# Altium footprint library Control_Board_Model.PcbLib: 160 footprints (part 3 of 10)
Each footprint in its own frame and in the unit in brackets; x right, y up, seen from the top. Pads: shape width x height; smd on the part's side, far side on the other; paste and mask are expansions set on the pad; w line width, h text height; cw(c..) or ccw(c..) is an arc to the next point about the centre after c.
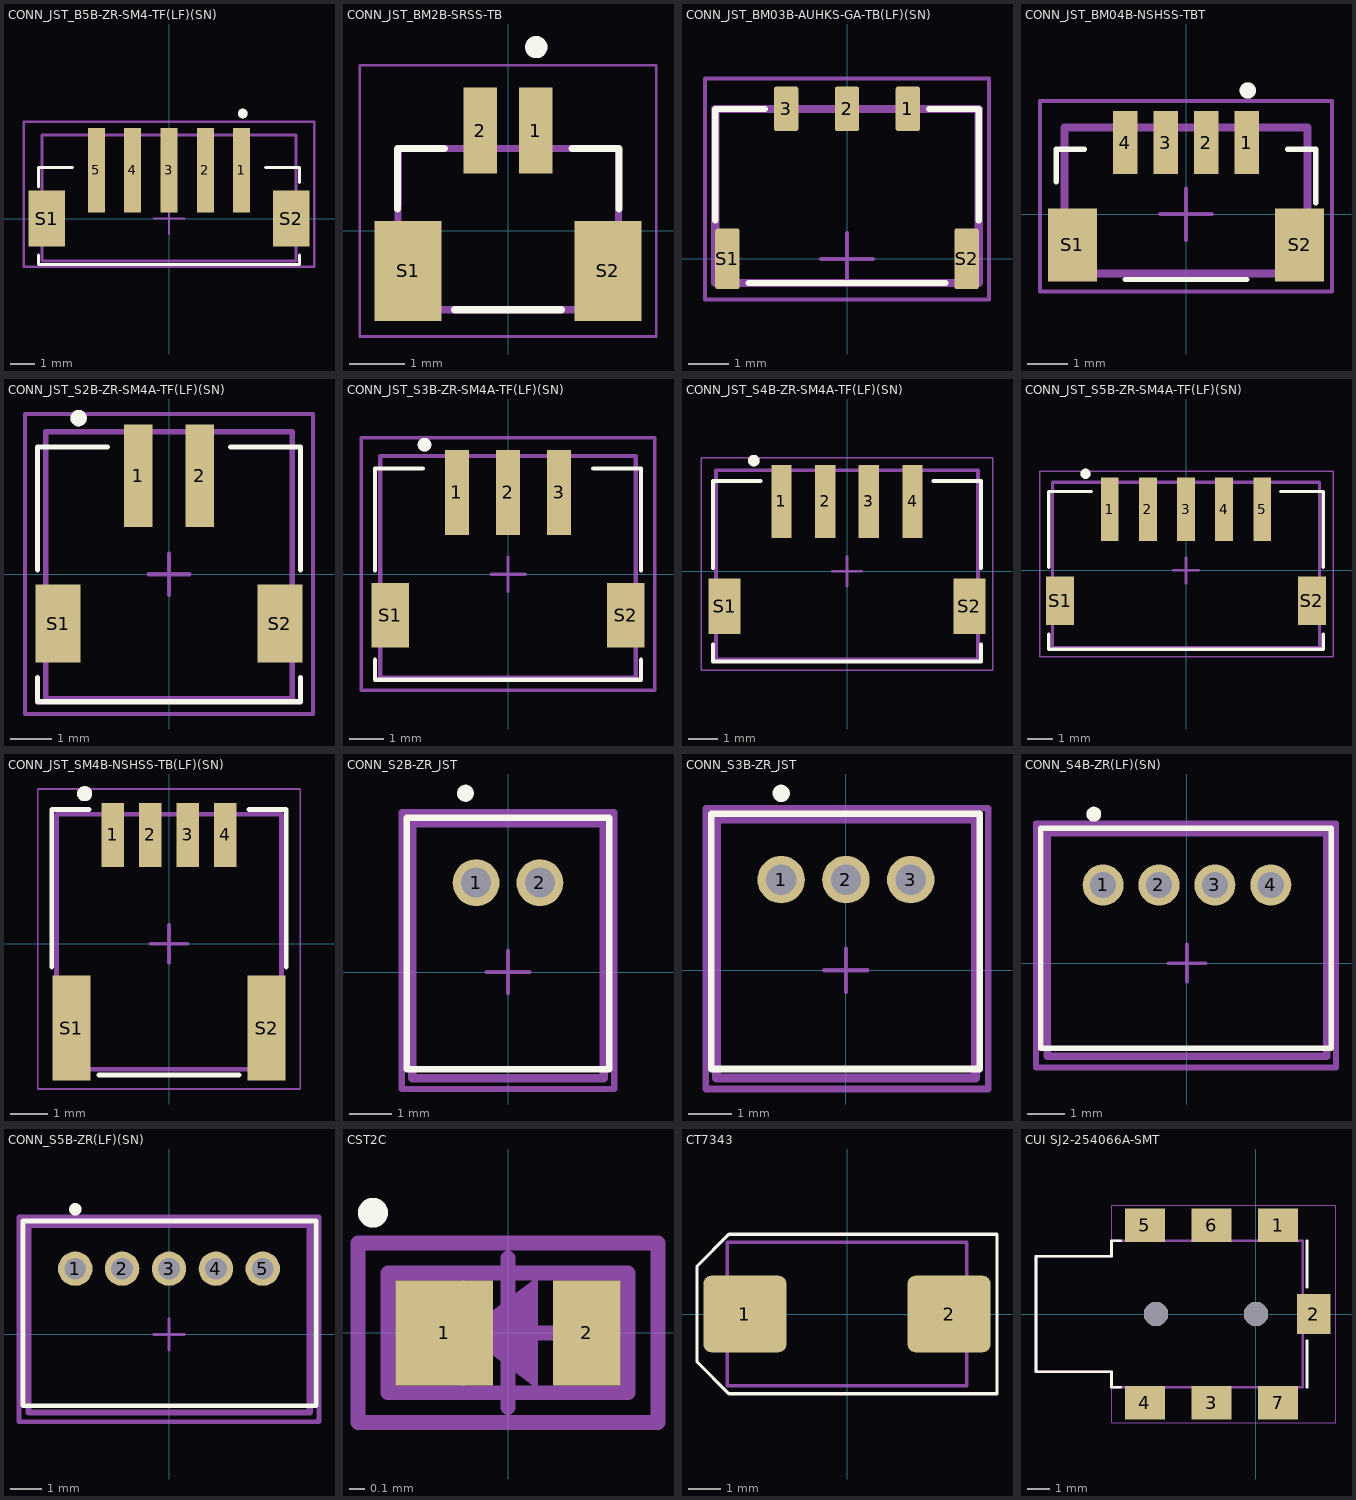
[diagram p2: the footprints below, top view; thin cyan lines are the x and y axes]

## CONN_JST_B5B-ZR-SM4-TF(LF)(SN) [mm]
pads (7):
  rect 0.7x3.5 smd: 1(3,2) 2(1.5,2) 3(0,2) 4(-1.5,2) 5(-3,2)
  rect 1.5x2.3 smd: S1(-5.05,0) S2(5.05,0)
Top Overlay:
  circle w0.2: c3.048,4.34 r0.1
  lines w0.127: -5.4,-1.5 -5.4,-1.9 5.4,-1.9 5.4,-1.5 ; -5.4,1.31 -5.4,2.1 -4,2.1 ; 4,2.1 5.4,2.1 5.4,1.5
Mechanical 14:
  circle w0.2: c3.048,4.34 r0.1
  lines w0.127: -5.25,-1.75 -5.25,3.45 5.25,3.45 5.25,-1.75 -5.25,-1.75
  text "'.Designator'" at -1.6,-0.2 h0.5
Mechanical 15:
  lines w0.1: -0.635,0 0.635,0 ; 0,-0.635 0,0.635 ; -6,-2 6,-2 6,4 -6,4 -6,-2
3D body "B5B-ZR-SM4-TF.STEP": height 5, standoff 0, extent -5.25,-1.75 5.25,3.45

## CONN_JST_BM2B-SRSS-TB [mm]
pads (4):
  rect 0.6x1.55 smd: 1(0.5,1.8) 2(-0.5,1.8)
  rect 1.2x1.8 smd: S1(-1.8,-0.725) S2(1.8,-0.725)
Top Overlay:
  circle w0.2: c0.508,3.302 r0.1
  lines w0.127: -1.99,0.386 -1.99,1.105 -1.99,1.475 -1.143,1.475 ; -0.96,-1.425 0.965,-1.425 ; 1.15,1.475 1.997,1.475 1.997,0.393
Mechanical 13:
  circle w0.2: c0.508,3.302 r0.1
  lines w0.127: -1.977,-1.372 -1.977,1.141 ; -1.969,0.468 -1.969,1.475 1.989,1.475 1.989,-1.425 -1.905,-1.425
Mechanical 15:
  lines w0.05: 0.976,2.974 2.667,2.974 2.667,-1.905 -2.667,-1.905 -2.667,2.974 2.5,2.974
3D body "BM02B-SRSS-TB.STEP": height 4.25, standoff -0.07, extent -2,-1.425 2,2.175

## CONN_JST_BM03B-AUHKS-GA-TB(LF)(SN) [mm] "Connector Header Surface Mount, Right Angle 3 position"
height 1.85
pads (5):
  rrect20% 0.6x1.1 smd mask+0.05: 1(1.5,3.7) 2(0,3.7) 3(-1.5,3.7)
  rrect20% 0.6x1.5 smd mask+0.05: S1(-2.95,0) S2(2.95,0)
Top Overlay:
  lines w0.15: -3.25,0.95 -3.25,3.7 -2.025,3.7 ; -2.425,-0.6 2.425,-0.6 ; 2.025,3.7 3.25,3.7 3.25,0.95
Mechanical 14:
  lines w0.2: -3.25,-0.6 -3.25,3.7 3.25,3.7 3.25,-0.6 -3.25,-0.6
Mechanical 15:
  lines w0.1: -0.635,0 0.635,0 ; 0,-0.635 0,0.635 ; -3.5,-1 -3.5,4.445 3.5,4.445 3.5,-1 -3.5,-1
3D body "BM03B-AUHKS.STEP": height 1.85, standoff 0, extent -3.275,-0.6 3.275,3.9

## CONN_JST_BM04B-NSHSS-TBT [mm] "Connector Header Surface Mount 4 position 0.039\" (1.00mm)"
height 4.25
pads (6):
  rect 0.6x1.55 smd: 1(1.5,1.762) 2(0.5,1.762) 3(-0.5,1.762) 4(-1.5,1.762)
  rect 1.2x1.8 smd: S1(-2.8,-0.763) S2(2.8,-0.763)
Top Overlay:
  circle w0.2: c1.524,3.048 r0.1
  lines w0.127: -3.2,0.787 -3.2,1.6 -2.5,1.6 ; -1.5,-1.613 1.5,-1.613 ; 2.5,1.6 3.2,1.6 3.2,0.279
Mechanical 14:
  lines w0.2: 1.624,3.048 cw(c1.524,3.048) 1.624,3.055 ; -3,-1.463 3,-1.463 3,2.137 -3,2.137 -3,-1.463
Mechanical 15:
  lines w0.1: -0.635,0 0.635,0 ; 0,-0.635 0,0.635 ; -3.6,-1.913 3.6,-1.913 3.6,2.788 -3.6,2.788 -3.6,-1.913
3D body "BM04B-SRSS-TB.STEP": height 4.25, standoff -0.07, extent -3,-1.463 3,2.137

## CONN_JST_S2B-ZR-SM4A-TF(LF)(SN) [mm] "Connector Header Surface Mount, Right Angle 2 position 0.059\" (1.50mm)"
height 3.7
pads (4):
  rect 0.7x2.5 smd: 1(-0.75,2.4) 2(0.75,2.4)
  rect 1.1x1.9 smd: S1(-2.7,-1.2) S2(2.7,-1.2)
Top Overlay:
  circle w0.2: c-2.2,3.8 r0.1
  lines w0.127: -3.2,-2.51 -3.2,-3.1 3.2,-3.1 3.2,-2.51 ; -3.2,0.11 -3.2,3.1 -1.5,3.1 ; 1.5,3.1 3.2,3.1 3.2,0.11
Mechanical 14:
  circle w0.2: c-2.2,3.8 r0.1
  lines w0.127: -3,-3.031 3,-3.031 3,3.469 -3,3.469 -3,-3.031
  text "'.Designator'" at -1.5,0 h0.5
Mechanical 15:
  lines w0.1: -0.5,0 0.5,0 ; 0,-0.5 0,0.5 ; -3.5,-3.4 3.5,-3.4 3.5,3.9 -3.5,3.9 -3.5,-3.4
3D body "S2B-ZR-SM4A-TF.STEP": height 3.7, standoff 0, extent -3,-3.031 3,3.469

## CONN_JST_S3B-ZR-SM4A-TF(LF)(SN) [mm]
pads (5):
  rect 0.7x2.5 smd: 1(-1.5,2.4) 2(0,2.4) 3(1.5,2.4)
  rect 1.1x1.9 smd: S1(-3.45,-1.2) S2(3.45,-1.2)
Top Overlay:
  circle w0.2: c-2.45,3.8 r0.1
  lines w0.127: -3.9,-2.51 -3.9,-3.1 3.9,-3.1 3.9,-2.51 ; -3.9,0.11 -3.9,3.1 -2.5,3.1 ; 2.5,3.1 3.9,3.1 3.9,0.11
Mechanical 14:
  circle w0.2: c-2.45,3.8 r0.1
  lines w0.127: -3.75,-3.031 -3.75,3.469 3.75,3.469 3.75,-3.031 -3.75,-3.031
  text "'.Designator'" at -1.4,-0.2 h0.5
Mechanical 15:
  lines w0.1: -0.5,0 0.5,0 ; 0,-0.5 0,0.5 ; -4.3,-3.4 -4.3,4 4.3,4 4.3,-3.4 -4.3,-3.4
3D body "S3B-ZR-SM4A-TF.STEP": height 3.7, standoff 0, extent -3.75,-3.031 3.75,3.469

## CONN_JST_S4B-ZR-SM4A-TF(LF)(SN) [mm]
pads (6):
  rect 0.7x2.5 smd: 1(-2.25,2.4) 2(-0.75,2.4) 3(0.75,2.4) 4(2.25,2.4)
  rect 1.1x1.9 smd: S1(-4.2,-1.2) S2(4.2,-1.2)
Top Overlay:
  circle w0.2: c-3.2,3.8 r0.1
  lines w0.127: -4.6,-2.51 -4.6,-3.1 4.6,-3.1 4.6,-2.51 ; -4.6,0.11 -4.6,3.1 -2.97,3.1 ; 2.97,3.1 4.6,3.1 4.6,0.11
Mechanical 14:
  circle w0.2: c-3.2,3.8 r0.1
  lines w0.127: -4.5,-3.031 4.5,-3.031 4.5,3.469 -4.5,3.469 -4.5,-3.031
  text "'.Designator'" at -1.5,0 h0.5
Mechanical 15:
  lines w0.05: -5,-3.4 5,-3.4 5,3.9 -5,3.9 -5,-3.4
  lines w0.1: -0.5,0 0.5,0 ; 0,-0.5 0,0.5
3D body "S4B-ZR-SM4A-TF.STEP": height 3.7, standoff 0, extent -4.5,-3.031 4.5,3.469

## CONN_JST_S5B-ZR-SM4A-TF(LF)(SN) [mm]
pads (7):
  rect 0.7x2.5 smd: 1(-3,2.4) 2(-1.5,2.4) 3(0,2.4) 4(1.5,2.4) 5(3,2.4)
  rect 1.1x1.9 smd: S1(-4.95,-1.2) S2(4.95,-1.2)
Top Overlay:
  circle w0.2: c-3.95,3.8 r0.1
  lines w0.127: -5.4,-2.51 -5.4,-3.1 5.4,-3.1 5.4,-2.51 ; -5.4,0.11 -5.4,3.1 -3.72,3.1 ; 3.72,3.1 5.4,3.1 5.4,0.11
Mechanical 14:
  circle w0.2: c-3.95,3.8 r0.1
  lines w0.127: -5.25,-3.031 5.25,-3.031 5.25,3.469 -5.25,3.469 -5.25,-3.031
  text "'.Designator'" at -2.25,0 h0.5
Mechanical 15:
  lines w0.05: -5.75,-3.4 5.8,-3.4 5.8,3.9 -5.75,3.9 -5.75,-3.4
  lines w0.1: -0.5,0 0.5,0 ; 0,-0.5 0,0.5
3D body "S5B-ZR-SM4A-TF.STEP": height 3.7, standoff 0, extent -5.25,-3.031 5.25,3.469

## CONN_JST_SM4B-NSHSS-TB(LF)(SN) [mm] "Connector Header Surface Mount, Right Angle 4 position 0.039\" (1.00mm)"
height 4.5
pads (6):
  rect 0.6x1.7 smd: 1(-1.5,2.9) 2(-0.5,2.9) 3(0.5,2.9) 4(1.5,2.9)
  rect 1x2.8 smd: S1(-2.6,-2.25) S2(2.6,-2.25)
Top Overlay:
  circle w0.2: c-2.25,4 r0.1
  lines w0.127: -3.125,-0.625 -3.125,3.575 -2.125,3.575 ; -1.875,-3.5 1.875,-3.5 ; 2.125,3.575 3.125,3.575 3.125,-0.625
Mechanical 14:
  circle w0.2: c-2.25,4 r0.1
  lines w0.127: -3,-3.35 -3,3.45 3,3.45 3,-3.35 -3,-3.35
  text "'.Designator'" at -1.5,0.5 h0.5
Mechanical 15:
  lines w0.05: -3.5,-3.875 -3.5,4.125 3.5,4.125 3.5,-3.875 -3.5,-3.875
  lines w0.1: -0.5,0 0.5,0 ; 0,-0.5 0,0.5
3D body "SM04B-NSHSS-TB.STEP": height 4.5, standoff 0, extent -3,-3.35 3,3.45

## CONN_S2B-ZR_JST [mm] "Connector Header Through Hole, Right Angle 2 position 0.059\" (1.50mm)"
height 3.7
pads (2):
  round 1.1 hole 0.7: 1(-0.75,2.1) 2(0.75,2.1)
Top Overlay:
  circle w0.2: c-1,4.2 r0.1
  lines w0.152: -2.375,-2.286 2.375,-2.286 2.375,3.627 -2.375,3.627 -2.375,-2.286
Mechanical 14:
  lines w0.2: -2.248,-2.494 2.248,-2.494 2.248,3.5 -2.248,3.5 -2.248,-2.494
  text "'.Designator'" at -0.8,-0.2 h0.5
  text "1" at -0.9,1.6 h1.02
  text "2" at 0.5,1.6 h1.02
Mechanical 15:
  lines w0.1: -0.5,0 0.5,0 ; 0,-0.5 0,0.5
  lines w0.152: -2.502,-2.748 -2.502,3.754 2.502,3.754 2.502,-2.748 -2.502,-2.748
3D body "S2B-ZR.STEP": height 3.8, standoff -2.6, extent -2.25,-2.495 2.25,3.505

## CONN_S3B-ZR_JST [mm] "Connector Header Through Hole, Right Angle 3 position 0.059\" (1.50mm)"
height 3.7
pads (3):
  round 1.1 hole 0.7: 1(-1.5,2.1) 2(0,2.1) 3(1.5,2.1)
Top Overlay:
  circle w0.2: c-1.5,4.1 r0.1
  lines w0.152: -3.125,-2.286 3.1,-2.286 3.1,3.627 -3.125,3.627 -3.125,-2.286
Mechanical 14:
  lines w0.2: -2.998,-2.494 3,-2.494 3,3.5 -2.998,3.5 -2.998,-2.494
  text "'.Designator'" at -0.7,-0.3 h0.5
  text "3" at 1.2,1.5 h1.02
  text "2" at -0.3,1.5 h1.02
  text "1" at -1.5,1.5 h1.02
Mechanical 15:
  lines w0.1: -0.5,0 0.5,0 ; 0,-0.5 0,0.5
  lines w0.152: -3.252,-2.748 -3.252,3.754 3.3,3.754 3.3,-2.748 -3.252,-2.748
3D body "S3B-ZR.STEP": height 3.8, standoff -2.6, extent -3,-2.494 3,3.506

## CONN_S4B-ZR(LF)(SN) [mm] "CONN HEADER R/A 4POS 1.5MM"
height 3.7
pads (4):
  round 1.1 hole 0.7: 1(-2.25,2.1) 2(-0.75,2.1) 3(0.75,2.1) 4(2.25,2.1)
Top Overlay:
  circle w0.2: c-2.5,4 r0.1
  lines w0.152: -3.924,-2.286 3.874,-2.286 3.874,3.627 -3.924,3.627 -3.924,-2.286
Mechanical 14:
  lines w0.2: -3.75,-2.5 3.75,-2.5 3.75,3.5 -3.75,3.5 -3.75,-2.5
  text "'.Designator'" at -0.9,-0.3 h0.5
  text "1" at -2.4,1.5 h1.02
  text "2" at -1,1.5 h1.02
  text "3" at 0.4,1.5 h1.02
  text "4" at 1.8,1.5 h1.02
Mechanical 15:
  lines w0.1: -0.5,0 0.5,0 ; 0,-0.5 0,0.5
  lines w0.152: -4.051,-2.799 -4.051,3.754 4.001,3.754 4.001,-2.799 -4.051,-2.799
3D body "S4B-ZR.STEP": height 3.8, standoff -2.6, extent -3.75,-2.5 3.75,3.5

## CONN_S5B-ZR(LF)(SN) [mm] "CONN HEADER R/A 5POS 1.5MM"
height 3.7
pads (5):
  round 1.1 hole 0.7: 1(-3,2.1) 2(-1.5,2.1) 3(0,2.1) 4(1.5,2.1) 5(3,2.1)
Top Overlay:
  circle w0.2: c-3,4 r0.1
  lines w0.152: -4.674,-2.286 4.7,-2.286 4.7,3.627 -4.674,3.627 -4.674,-2.286
Mechanical 14:
  lines w0.2: -4.5,-2.5 4.5,-2.5 4.5,3.5 -4.5,3.5 -4.5,-2.5
  text "1" at -3.1,1.5 h1.02
  text "2" at -1.8,1.5 h1.02
  text "3" at -0.3,1.5 h1.02
  text "4" at 1.2,1.5 h1.02
  text "5" at 2.7,1.5 h1.02
  text "'.Designator'" at -0.8,-0.2 h0.5
Mechanical 15:
  lines w0.1: -0.5,0 0.5,0 ; 0,-0.5 0,0.5
  lines w0.152: -4.801,-2.799 -4.801,3.754 4.8,3.754 4.8,-2.799 -4.801,-2.799
3D body "S5B-ZR.STEP": height 3.8, standoff -2.6, extent -4.5,-2.5 4.5,3.5

## CST2C [mm]
height 0.5
pads (2):
  rect 0.65x0.7 smd: 1(-0.425,0)
  rect 0.45x0.7 smd: 2(0.525,0)
Top Overlay:
  circle w0.1: c-0.9,0.8 r0.05
Mechanical 14:
  region: -0.3,0 0.2,0.375 0.2,-0.375
  lines w0.1: -0.3,-0.3 -0.3,0.3 ; -0.8,-0.4 0.8,-0.4 0.8,0.4 -0.8,0.4 -0.8,-0.4
  text "'.Designator'" at -0.8,0.8 h0.5
Mechanical 15:
  lines w0.1: -0.5,0 0.5,0 ; 0,-0.5 0,0.5 ; -1,-0.6 1,-0.6 1,0.6 -1,0.6 -1,-0.6
3D body: height 0.5, standoff 0, extent -0.799,-0.399 0.799,0.399

## CT7343 [mm]
pads (2):
  rrect20% 2.6x2.4 smd: 1(-3.2,0) 2(3.2,0)
Top Overlay:
  lines w0.1: -4.7,-1.5 -3.7,-2.5 4.7,-2.5 4.7,2.5 -3.7,2.5 -4.7,1.5 -4.7,-1.5
Mechanical 14:
  lines w0.1: -3.75,-2.25 -3.75,2.25 3.75,2.25 3.75,-2.25 -3.75,-2.25
3D body "User Library-CAP_TANT_7343-31.step": height 3.1, standoff 0, extent -3.8,-2.3 3.8,2.3

## CUI SJ2-254066A-SMT [mm]
pads (9):
  rect 1.8x1.5 smd: 1(1,4) 3(-2,-4) 4(-5,-4) 5(-5,4) 6(-2,4) 7(1,-4)
  rect 1.5x1.8 smd: 2(2.6,0)
  round 1.1 hole 1.1 unplated: ""(-4.5,0) ""(0,0)
Top Overlay:
  lines w0.127: -6.1,-3.3 -6.5,-3.3 -6.5,-2.6 -9.9,-2.6 -9.9,2.6 -6.5,2.6 -6.5,3.3 -6.1,3.3 ; 2.3,-3.3 2.3,-1.2 ; 2.3,1.2 2.3,3.3
Mechanical 13:
  lines w0.127: -9.9,-2.6 -9.9,2.6 -6.5,2.6 -6.5,3.3 -2.75,3.3 2.1,3.3 2.1,-3.3 -6.5,-3.3 -6.5,-2.6 -9.9,-2.6
Mechanical 15:
  lines w0.05: -9.9,-2.6 -9.9,2.6 -6.5,2.6 -6.5,4.9 -5.95,4.9 -0.2,4.9 3.6,4.9 3.6,3.25 3.6,1.95 3.6,-4.9 -6.5,-4.9 -6.5,-3.65 -6.5,-2.6 -9.9,-2.6
3D body "CUI_DEVICES_SJ2-254066A-SMT-TR.step": height 4.2, standoff -1, extent -9.9,-4.3 3.1,4.3